# Altium footprint library SMT.PcbLib: 325 footprints (part 10 of 21)
Each footprint in its own frame and in the unit in brackets; x right, y up, seen from the top. Pads: shape width x height; smd on the part's side, far side on the other; paste and mask are expansions set on the pad; w line width, h text height; cw(c..) or ccw(c..) is an arc to the next point about the centre after c.
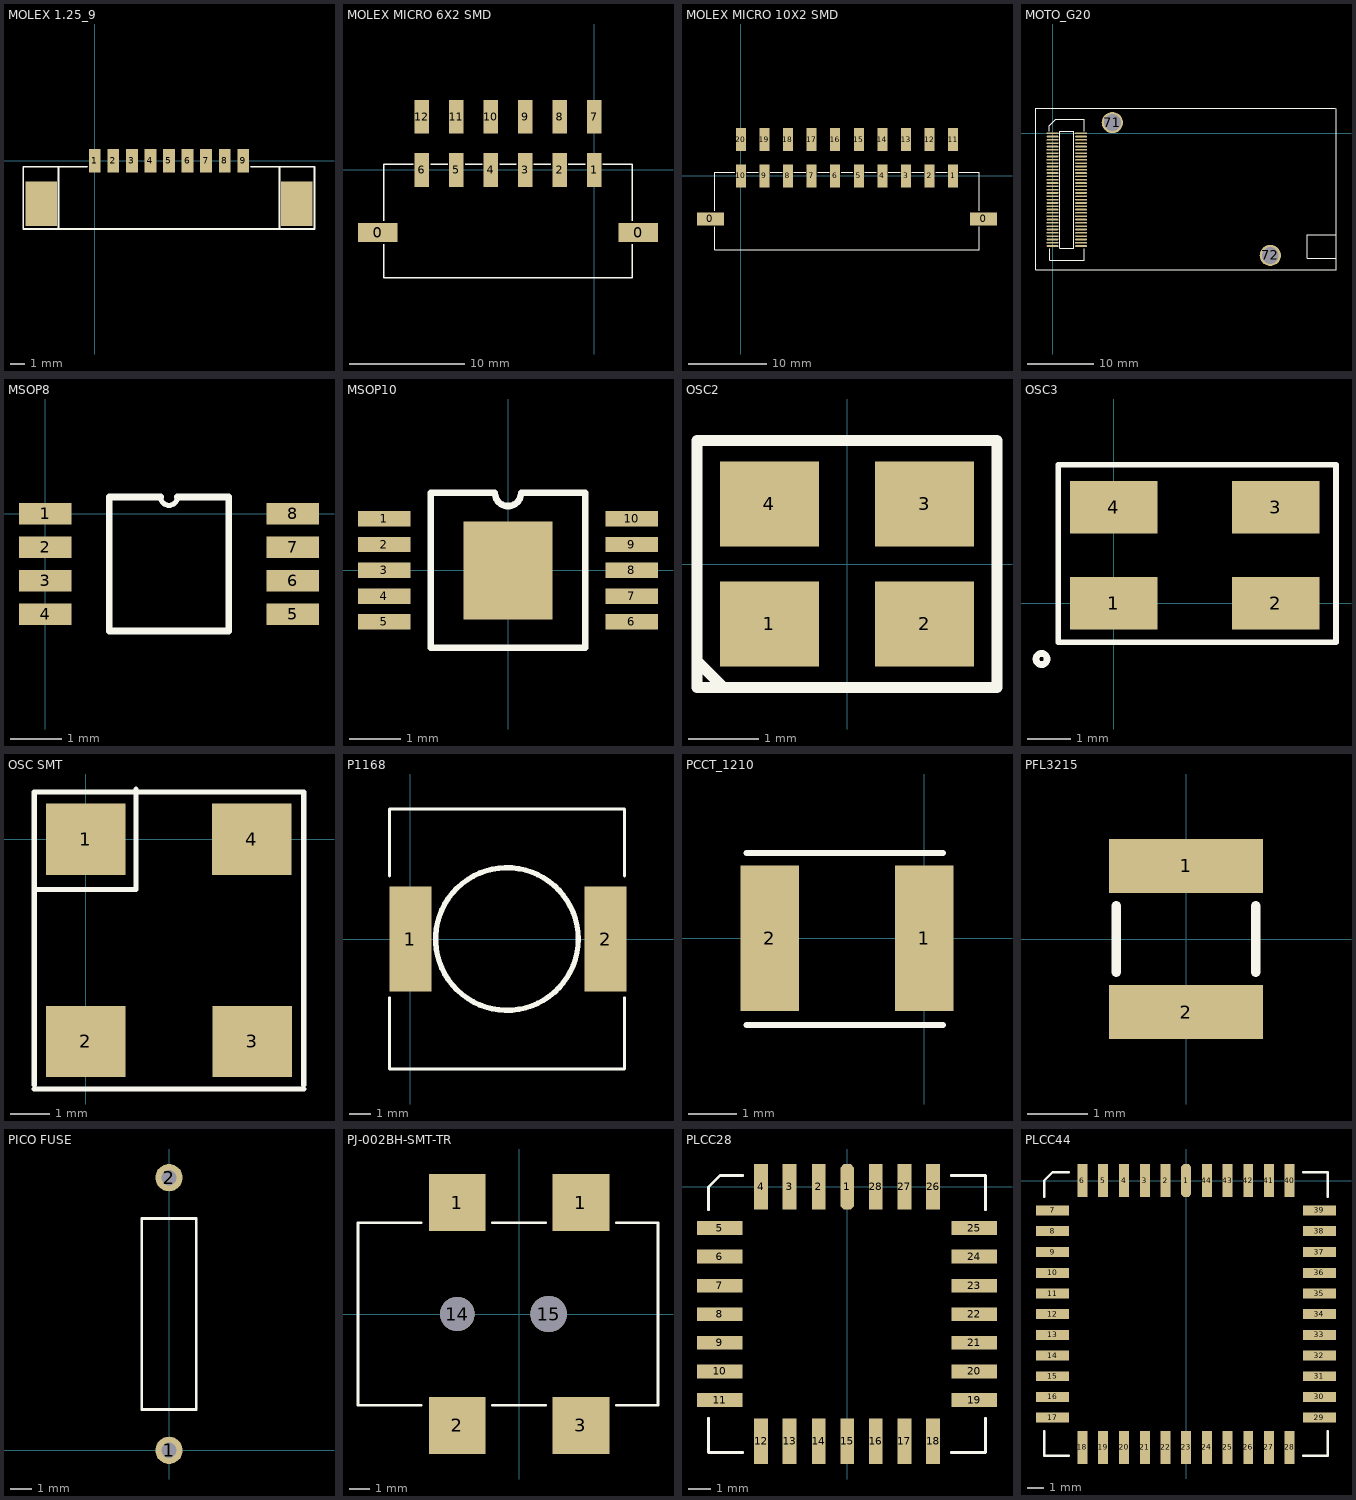
[diagram p9: the footprints below, top view; thin cyan lines are the x and y axes]

## MOLEX 1.25_9 [mm]
pads (11):
  rect 0.8x1.6 smd: 1(0,0) 2(1.25,0) 3(2.5,0) 4(3.75,0) 5(5,0) 6(6.25,0) 7(7.5,0) 8(8.75,0) 9(10,0)
  rect 2.1x3 smd: ""(-3.6,-2.9) ""(13.6,-2.9)
TopOverlay:
  lines w0.127: -2.44,-4.59 -2.44,-0.4 ; -0.53,-0.4 -4.81,-0.4 -4.81,-4.6 14.8,-4.6 14.8,-0.4 10.52,-0.4 ; 12.44,-4.59 12.44,-0.4

## MOLEX MICRO 6X2 SMD [mm]
pads (14):
  rect 3.43x1.65 smd: 0(-18.85,-5.45) 0(3.85,-5.45)
  rect 1.27x2.92 smd: 1(0,0) 2(-3,0) 3(-6,0) 4(-9,0) 5(-12,0) 6(-15,0) 7(0,4.63) 8(-3,4.63) 9(-6,4.63) 10(-9,4.63) 11(-12,4.63) 12(-15,4.63)
TopOverlay:
  lines w0.127: -18.31,-6.46 -18.31,-9.4 3.34,-9.4 3.34,-6.46 ; -18.31,-4.42 -18.31,0.5 -15.76,0.5 ; -14.24,0.5 -12.76,0.5 ; -11.24,0.5 -9.76,0.5 ; -8.24,0.5 -6.76,0.5 ; -5.24,0.5 -3.76,0.5 ; -2.24,0.5 -0.76,0.5 ; 0.76,0.5 3.34,0.5 3.34,-4.42

## MOLEX MICRO 10X2 SMD [mm]
pads (22):
  rect 3.43x1.65 smd: 0(-3.85,-5.45) 0(30.85,-5.45)
  rect 1.27x2.92 smd: 1(27,0) 2(24,0) 3(21,0) 4(18,0) 5(15,0) 6(12,0) 7(9,0) 8(6,0) 9(3,0) 10(0,0) 11(27,4.63) 12(24,4.63) 13(21,4.63) 14(18,4.63) 15(15,4.63) 16(12,4.63) 17(9,4.63) 18(6,4.63) 19(3,4.63) 20(0,4.63)
TopOverlay:
  lines w0.127: -3.31,-6.46 -3.31,-9.4 30.34,-9.4 30.34,-6.46 ; -3.31,-4.42 -3.31,0.5 -0.76,0.5 ; 0.76,0.5 2.24,0.5 ; 3.76,0.5 5.24,0.5 ; 6.76,0.5 8.24,0.5 ; 9.76,0.5 11.24,0.5 ; 12.76,0.5 14.24,0.5 ; 15.76,0.5 17.24,0.5 ; 18.76,0.5 20.24,0.5 ; 21.76,0.5 23.24,0.5 ; 24.76,0.5 26.24,0.5 ; 27.76,0.5 30.34,0.5 30.34,-4.42

## MOTO_G20 [mm]
pads (72):
  rect 1.8x0.25 smd: 1(0,0)
  oval 1.8x0.25 smd: 2(4.3,0) 3(0,-0.5) 4(4.3,-0.5) 5(0,-1) 6(4.3,-1) 7(0,-1.5) 8(4.3,-1.5) 9(0,-2) 10(4.3,-2) 11(0,-2.5) 12(4.3,-2.5) 13(0,-3) 14(4.3,-3) 15(0,-3.5) 16(4.3,-3.5) 17(0,-4) 18(4.3,-4) 19(0,-4.5) 20(4.3,-4.5) 21(0,-5) 22(4.3,-5) 23(0,-5.5) 24(4.3,-5.5) 25(0,-6) 26(4.3,-6) 27(0,-6.5) 28(4.3,-6.5) 29(0,-7) 30(4.3,-7) 31(0,-7.5) 32(4.3,-7.5) 33(0,-8) 34(4.3,-8) 35(0,-8.5) 36(4.3,-8.5) 37(0,-9) 38(4.3,-9) 39(0,-9.5) 40(4.3,-9.5) 41(0,-10) 42(4.3,-10) 43(0,-10.5) 44(4.3,-10.5) 45(0,-11) 46(4.3,-11) 47(0,-11.5) 48(4.3,-11.5) 49(0,-12) 50(4.3,-12) 51(0,-12.5) 52(4.3,-12.5) 53(0,-13) 54(4.3,-13) 55](0,-13.5) 56(4.3,-13.5) 57(0,-14) 58(4.3,-14) 59(0,-14.5) 60(4.3,-14.5) 61(0,-15) 62(4.3,-15) 63(0,-15.5) 64(4.3,-15.5) 65(0,-16) 66(4.3,-16) 67(0,-16.5) 68(4.3,-16.5) 69(0,-17) 70(4.3,-17)
  round 3.2 hole 2.54: 71(9,1.6) 72(32.8,-18.4)
TopOverlay:
  lines w0.127: -0.5,0.3 -0.5,1.1 0.5,2.1 4.8,2.1 4.8,0.3 ; -0.4,-17.4 -0.4,-19.1 4.8,-19.1 4.8,-17.4 ; 42.7,-18.7 42.7,-18.8 38.4,-18.8 38.4,-15.3 42.7,-15.3 ; -2.5,-20.6 42.7,-20.6 42.7,3.7 42.6,3.8 -2.5,3.8 -2.5,0 -2.5,-20.6 ; 1.1,-17.3 1.1,0.3 3.2,0.3 3.2,-17.3 1.1,-17.3

## MSOP8 [mm]
pads (8):
  rect 1.02x0.41 smd: 1(0,0) 2(0,-0.65) 3(0,-1.3) 4(0,-1.95) 5(4.8,-1.95) 6(4.8,-1.3) 7(4.8,-0.65) 8(4.8,0)
TopOverlay:
  lines w0.1: 2.238,0.325 ccw(c2.4,0.325) 2.562,0.325
  lines w0.127: 2.238,0.325 1.245,0.325 1.245,-2.275 3.555,-2.275 3.555,0.325 2.562,0.325

## MSOP10 [mm]
height 1.09
pads (11):
  rect 1.02x0.3 smd: 1(-2.4,1) 2(-2.4,0.5) 3(-2.4,0) 4(-2.4,-0.5) 5(-2.4,-1) 6(2.4,-1) 7(2.4,-0.5) 8(2.4,0) 9(2.4,0.5) 10(2.4,1)
  rect 1.73x1.9 smd: ""(0,0)
TopOverlay:
  lines w0.127: -1.5,-1.5 -1.5,1.5 -0.254,1.5 ccw(c0,1.5) 0.254,1.5 1.5,1.5 1.5,-1.5 0,-1.5 -1.5,-1.5
3D body: height 1.09, standoff 0, extent -1.499,-1.499 1.499,1.499

## OSC2 [mm] "ABM8G Series - 3.2mm X 2.5mm"
height 1
pads (4):
  rect 1.4x1.2 smd: 1(-1.1,-0.85) 2(1.1,-0.85) 3(1.1,0.85) 4(-1.1,0.85)
TopOverlay:
  lines w0.152: -2.125,-1.375 -1.75,-1.75 -1.7,-1.75 ; -2.125,-1.75 2.125,-1.75 2.125,1.75 -2.125,1.75 -2.125,-1.75

## OSC3 [mm]
pads (4):
  rect 2x1.2 smd: 1(0,0) 2(3.7,0) 3(3.7,2.2) 4(0,2.2)
TopOverlay:
  circle w0.152: c-1.651,-1.27 r0.127
  lines w0.127: -1.27,-0.889 -1.27,3.175 5.08,3.175 5.08,-0.889 -1.27,-0.889

## OSC SMT [mm]
pads (4):
  rect 2x1.8 smd: 1(0,0) 2(0,-5.1) 3(4.2,-5.1) 4(4.191,0)
TopOverlay:
  lines w0.127: -1.3,-6.3 5.5,-6.3 ; -1.3,-6.2 -1.3,1.2 5.5,1.2 5.5,-6.2 ; -1.27,-1.27 1.27,-1.27 1.27,1.27

## P1168 [mm]
pads (2):
  rect 2x5 smd: 1(0,0) 2(9.3,0)
TopOverlay:
  circle w0.254: c4.6,0 r3.4
  lines w0.127: -1,-2.8 -1,-6.2 10.2,-6.2 10.2,-3 10.2,-2.8 ; -1,3 -1,6.2 10.2,6.2 10.2,3

## PCCT_1210 [mm]
pads (2):
  rect 1.2x3 smd: 1(0,0) 2(-3.175,0)
TopOverlay:
  lines w0.127: -3.651,-1.784 -1.595,-1.784 0.389,-1.784 ; -3.651,1.751 -1.595,1.751 0.389,1.751
3D body "CAP 1210-1.4mm.STEP": height 1.4, standoff 0, extent -3.175,-1.25 0.025,1.25

## PFL3215 [mm] "CHIP INDUCTOR"
height 1.5
pads (2):
  rect 2.54x0.89 smd: 1(0,1.205) 2(0,-1.205)
TopOverlay:
  lines w0.152: -1.15,-0.55 -1.15,0.55 ; 1.15,-0.55 1.15,0.55

## PICO FUSE [mil]
pads (2):
  round 50 hole 28: 1(0,0) 2(0,500)
TopOverlay:
  lines w5: -50,75 -50,425 50,425 50,75 -50,75

## PJ-002BH-SMT-TR [mm] "CUI INC"
height 11
pads (6):
  rect 2.8x2.8 smd: 1(-3.05,5.5) 1(3.05,5.5) 2(-3.05,-5.5) 3(3.05,-5.5)
  round 1.7 hole 1.7 unplated: 14(-3.05,0)
  round 1.8 hole 1.8 unplated: 15(1.45,0)
TopOverlay:
  lines w0.127: -4.825,-4.5 -7.95,-4.5 -7.95,4.5 -4.825,4.5 ; -1.325,-4.5 1.3,-4.5 ; -1.325,4.5 1.3,4.5 ; 4.8,-4.5 6.85,-4.5 6.85,4.5 4.8,4.5
3D body "CUI_PJ-002BH-SMT-TR.step": height 11.18, standoff -1.02, extent -8.075,-6.25 6.725,6.35

## PLCC28 [mil]
pads (28):
  oct 24x80 smd: 1(0,0)
  rect 24x80 smd: 2(-50,0) 3(-101,0) 4(-151,0) 12(-151,-445) 13(-101,-445) 14(-50,-445) 15(0,-445) 16(50,-445) 17(100,-445) 18(150,-445) 26(150,0) 27(100,0) 28(50,0)
  rect 80x24 smd: 5(-223,-72) 6(-223,-122) 7(-223,-173) 8(-223,-223) 9(-223,-273) 10(-223,-323) 11(-223,-373) 19(222,-373) 20(222,-323) 21(222,-273) 22(222,-223) 23(222,-173) 24(222,-122) 25(222,-72)
TopOverlay:
  lines w5: -243,-405 -243,-465 -183,-465 ; -243,-40 -243,0 -223,20 -183,20 ; 182,-465 242,-465 242,-405 ; 182,20 242,20 242,-40

## PLCC44 [mil]
pads (44):
  oct 24x80 smd: 1(0,0)
  rect 24x80 smd: 2(-50,0) 3(-100,0) 4(-150,0) 5(-201,0) 6(-251,0) 18(-251,-645) 19(-201,-645) 20(-150,-645) 21(-100,-645) 22(-50,-645) 23(0,-645) 24(50,-645) 25(100,-645) 26(150,-645) 27(200,-645) 28(250,-645) 40(250,0) 41(200,0) 42(150,0) 43(100,0) 44(50,0)
  rect 80x24 smd: 7(-323,-72) 8(-323,-122) 9(-323,-173) 10(-323,-223) 11(-323,-273) 12(-323,-323) 13(-323,-373) 14(-323,-423) 15(-323,-473) 16(-323,-523) 17(-323,-573) 29(322,-573) 30(322,-523) 31(322,-473) 32(322,-423) 33(322,-373) 34(322,-323) 35(322,-273) 36(322,-223) 37(322,-173) 38(322,-122) 39(322,-72)
TopOverlay:
  lines w5: -343,-605 -343,-665 -283,-665 ; -343,-40 -343,0 -323,20 -283,20 ; 282,-665 342,-665 342,-605 ; 282,20 342,20 342,-40